# Altium footprint library hphonglib.PcbLib: 703 footprints (part 3 of 44)
Each footprint in its own frame and in the unit in brackets; x right, y up, seen from the top. Pads: shape width x height; smd on the part's side, far side on the other; paste and mask are expansions set on the pad; w line width, h text height; cw(c..) or ccw(c..) is an arc to the next point about the centre after c.
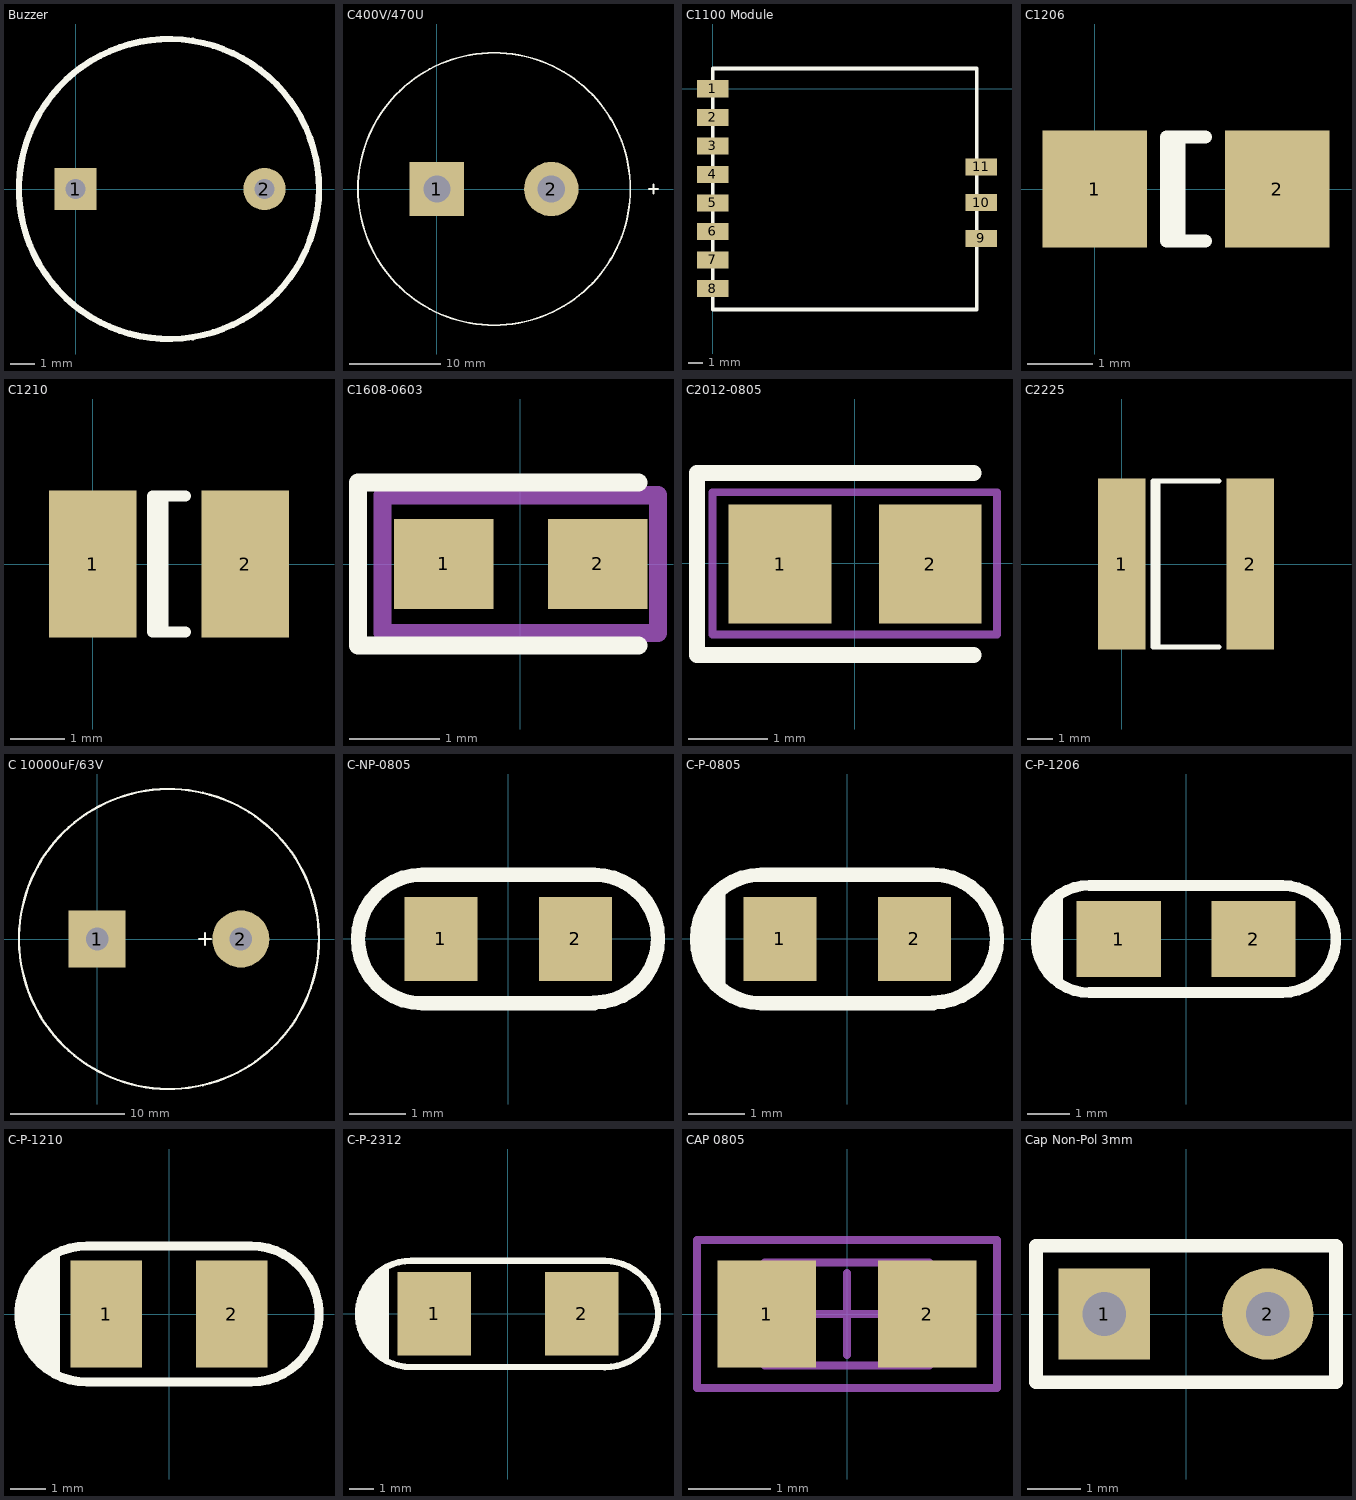
[diagram p2: the footprints below, top view; thin cyan lines are the x and y axes]

## Buzzer [mil] "Buzzer; Solder Pad 35mil"
pads (2):
  rect 67x67 hole 32: 1(0,0)
  round 67 hole 32: 2(300,0)
Top Overlay:
  circle w10: c148.29,0 r238.29
3D body: height 177.17, standoff -379.92, extent -86.21,-236.21 522.21,236.23

## C400V/470U [mm]
pads (2):
  rect 6x6 hole 3: 1(0,0)
  round 6 hole 3: 2(12.6,0)
Top Overlay:
  circle w0.2: c6.3,0 r15
  lines w0.2: 23.332,0 24.348,0 ; 23.84,-0.508 23.84,0.508
3D body: height 46, standoff -3.62, extent -11.557,-18.034 24.003,17.526

## C1100 Module [mm] "TI Wireless Module"
pads (11):
  rect 2.2x1.2 smd: 1(0,0) 2(0,-2.007) 3(0,-4.013) 4(0,-6.02) 5(0,-8.026) 6(0,-10.033) 7(0,-12.04) 8(0,-14.046) 9(18.898,-10.516) 10(18.898,-8.001) 11(18.898,-5.486)
Top Overlay:
  lines w0.254: 0,-15.519 18.567,-15.519 18.567,1.422 0,1.422 0,-15.519

## C1206 [mm] "Chip Capacitor; Body 3.2 x 1.6 mm (LxW typ)"
height 1.35
pads (2):
  rect 1.6x1.8 smd: 1(0,0) 2(2.8,0)
Top Overlay:
  lines w0.2: 1.29,-0.8 1.29,0.8 ; 1.7,-0.8 1.1,-0.8 1.1,0.8 1.7,0.8

## C1210 [mm] "Chip Capacitor; Body 3.2 x 2.5 mm (LxW typ)"
height 1.35
pads (2):
  rect 1.6x2.7 smd: 1(0,0) 2(2.8,0)
Top Overlay:
  lines w0.2: 1.29,-1.25 1.29,1.25 ; 1.7,-1.25 1.1,-1.25 1.1,1.25 1.7,1.25

## C1608-0603 [mm] "Capacitor Chip 0603 package"
pads (2):
  rect 1.1x1 smd: 1(-0.843,0.001) 2(0.857,0.001)
Top Overlay:
  lines w0.2: 1.307,-0.899 -1.793,-0.899 -1.793,0.901 1.307,0.901
Mechanical 13:
  lines w0.2: -1.524,-0.762 -1.524,0.762 1.524,0.762 1.524,-0.762 -1.524,-0.762
3D body: height 0.76, standoff 0, extent -0.356,-0.406 0.356,0.406
3D body: height 0.81, standoff 0, extent -0.711,-0.432 -0.356,0.432
3D body: height 0.81, standoff 0, extent 0.356,-0.432 0.711,0.432

## C2012-0805 [mm] "Capacitor Chip 0805 package"
pads (2):
  rect 1.3x1.5 smd: 1(-0.945,-0.007) 2(0.955,-0.007)
Top Overlay:
  lines w0.2: 1.505,-1.157 -1.995,-1.157 -1.995,1.143 1.505,1.143
Mechanical 13:
  lines w0.1: -1.8,-0.9 1.8,-0.9 1.8,0.9 -1.8,0.9 -1.8,-0.9
3D body: height 0.76, standoff 0, extent -0.381,-0.572 0.381,0.572
3D body: height 0.79, standoff 0, extent 0.381,-0.584 0.889,0.584
3D body: height 0.79, standoff 0, extent -0.889,-0.584 -0.381,0.584

## C2225 [mm] "Chip Capacitor; Body 5.6 x 6.4 mm (LxW typ)"
height 1.1
pads (2):
  rect 1.9x6.8 smd: 1(0,0) 2(5.1,0)
Top Overlay:
  lines w0.2: 1.44,-3.3 1.44,3.3 ; 3.85,-3.3 1.25,-3.3 1.25,3.3 3.85,3.3

## C 10000uF/63V [mm]
pads (2):
  rect 5x5 hole 2: 1(0,0)
  round 5 hole 2: 2(12.6,0)
Top Overlay:
  circle w0.2: c6.3,0 r13.158
  lines w0.2: 8.942,0 9.958,0 ; 9.45,-0.508 9.45,0.508

## C-NP-0805 [mm] "Chip Capacitor; Non-polarized; Body 2.0 x 1.3 mm (LxW typ) [2012]"
height 0.65
pads (2):
  rect 1.3x1.5 smd: 1(-1.194,0) 2(1.194,0)
Top Overlay:
  lines w0.254: 1.524,-1.143 -1.524,-1.143 cw(c-1.524,0) -1.524,1.143 1.524,1.143 cw(c1.524,0.007) 1.524,-1.129
3D body: height 0.79, standoff -0.01, extent -0.8,-0.428 0.8,0.432

## C-P-0805 [mm] "Chip Capacitor; Polarized; Body 2.0 x 1.3 mm (LxW typ) [2012]"
height 0.65
pads (2):
  rect 1.3x1.5 smd: 1(-1.194,0) 2(1.194,0)
Top Overlay:
  lines w0.254: -2.54,-0.508 -2.54,0.508 ; -2.286,-0.762 -2.286,0.762 ; 1.524,-1.143 -1.524,-1.143 cw(c-1.524,0) -1.524,1.143 1.524,1.143 cw(c1.524,0.007) 1.524,-1.129
3D body: height 1.61, standoff 0, extent -1.595,-0.8 1.595,0.8

## C-P-1206 [mm] "Chip Capacitor; Body 3.2 x 1.6 mm (LxW typ) [3216]"
height 2.54
pads (2):
  rect 2x1.8 smd: 1(-1.6,0) 2(1.6,0)
Top Overlay:
  lines w0.254: -3.429,-0.508 -3.429,0.508 ; -3.302,-0.762 -3.302,0.762 ; -3.175,-0.889 -3.175,0.889 ; -3.048,-1.016 -3.048,1.016 ; -2.286,-1.276 cw(c-2.286,0) -2.286,1.276 ; -2.286,-1.27 2.286,-1.27 ccw(c2.286,0) 2.286,1.27 -2.286,1.27
3D body: height 1.61, standoff 0, extent -1.595,-0.8 1.596,0.8

## C-P-1210 [mm] "Chip Capacitor; Body 3.5 x 2.8 mm (LxW typ) [3528]"
height 2.54
pads (2):
  rect 2x3 smd: 1(-1.753,0) 2(1.753,0)
Top Overlay:
  lines w0.254: -4.064,-0.635 -4.064,0.635 ; -3.937,-0.889 -3.937,0.889 ; -3.81,-1.143 -3.81,1.143 ; -3.683,-1.27 -3.683,1.27 ; -3.556,-1.397 -3.556,1.397 ; -3.429,-1.524 -3.429,1.524 ; -3.302,-1.524 -3.302,1.524 ; -3.175,-1.651 -3.175,1.651 ; -2.286,-1.905 cw(c-2.286,0) -2.286,1.905 2.286,1.905 cw(c2.286,0) 2.286,-1.905 -2.286,-1.905
3D body: height 1.91, standoff 0, extent -1.746,-1.4 1.746,1.4

## C-P-2312 [mm] "Chip Capacitor; Polarized; Body 6.0 x 3.2 mm (LxW typ) [6032]"
height 2.54
pads (2):
  rect 3x3.4 smd: 1(-2.997,0) 2(2.997,0)
Top Overlay:
  lines w0.254: -5.969,-0.635 -5.969,0.635 ; -5.842,-0.889 -5.842,0.889 ; -5.715,-1.143 -5.715,1.143 ; -5.588,-1.27 -5.588,1.27 ; -5.461,-1.397 -5.461,1.397 ; -5.334,-1.524 -5.334,1.524 ; -5.207,-1.651 -5.207,1.651 ; -5.08,-1.778 -5.08,1.778 ; -4.953,-1.905 -4.953,1.905 ; 3.937,-2.166 ccw(c3.937,-0.007) 3.937,2.152 ; 3.937,-2.159 -3.937,-2.159 cw(c-3.937,0) -3.937,2.159 3.937,2.159
3D body: height 2.51, standoff 0, extent -2.997,-1.6 2.997,1.6

## CAP 0805 [mm] "Molded Capacitor, 2-Leads, Body 2,0x1,3mm, IPC Medium Density"
height 1.8
pads (2):
  rect 1.2x1.3 smd: 1(-0.975,0) 2(0.975,0)
Mechanical 13:
  lines w0.1: -1,-0.625 1,-0.625 1,0.625 -1,0.625 -1,-0.625
Mechanical 15:
  lines w0.1: -0.5,0 0.5,0 ; 0,-0.5 0,0.5 ; -1.825,-0.9 1.825,-0.9 1.825,0.9 -1.825,0.9 -1.825,-0.9
3D body: height 1.8, standoff 0, extent -1,-0.625 1,0.625

## Cap Non-Pol 3mm [mil] "Capacitor, Radial; Body 5.6 x 2.5 mm (L x W typ); Pin Spacing 3 mm (typ); Solder Pad 35mil"
pads (2):
  rect 67x67 hole 32: 1(-60,0)
  round 67 hole 32: 2(60,0)
Top Overlay:
  lines w10: -110,-50 -110,50 110,50 110,-50 -110,-50
3D body: height 245, standoff -66.85, extent -114.93,-32.79 114.93,34